# Altium footprint library con-samtec.PCBLIB: 805 footprints (part 15 of 55)
Each footprint in its own frame and in the unit in brackets; x right, y up, seen from the top. Pads: shape width x height; smd on the part's side, far side on the other; paste and mask are expansions set on the pad; w line width, h text height; cw(c..) or ccw(c..) is an arc to the next point about the centre after c.
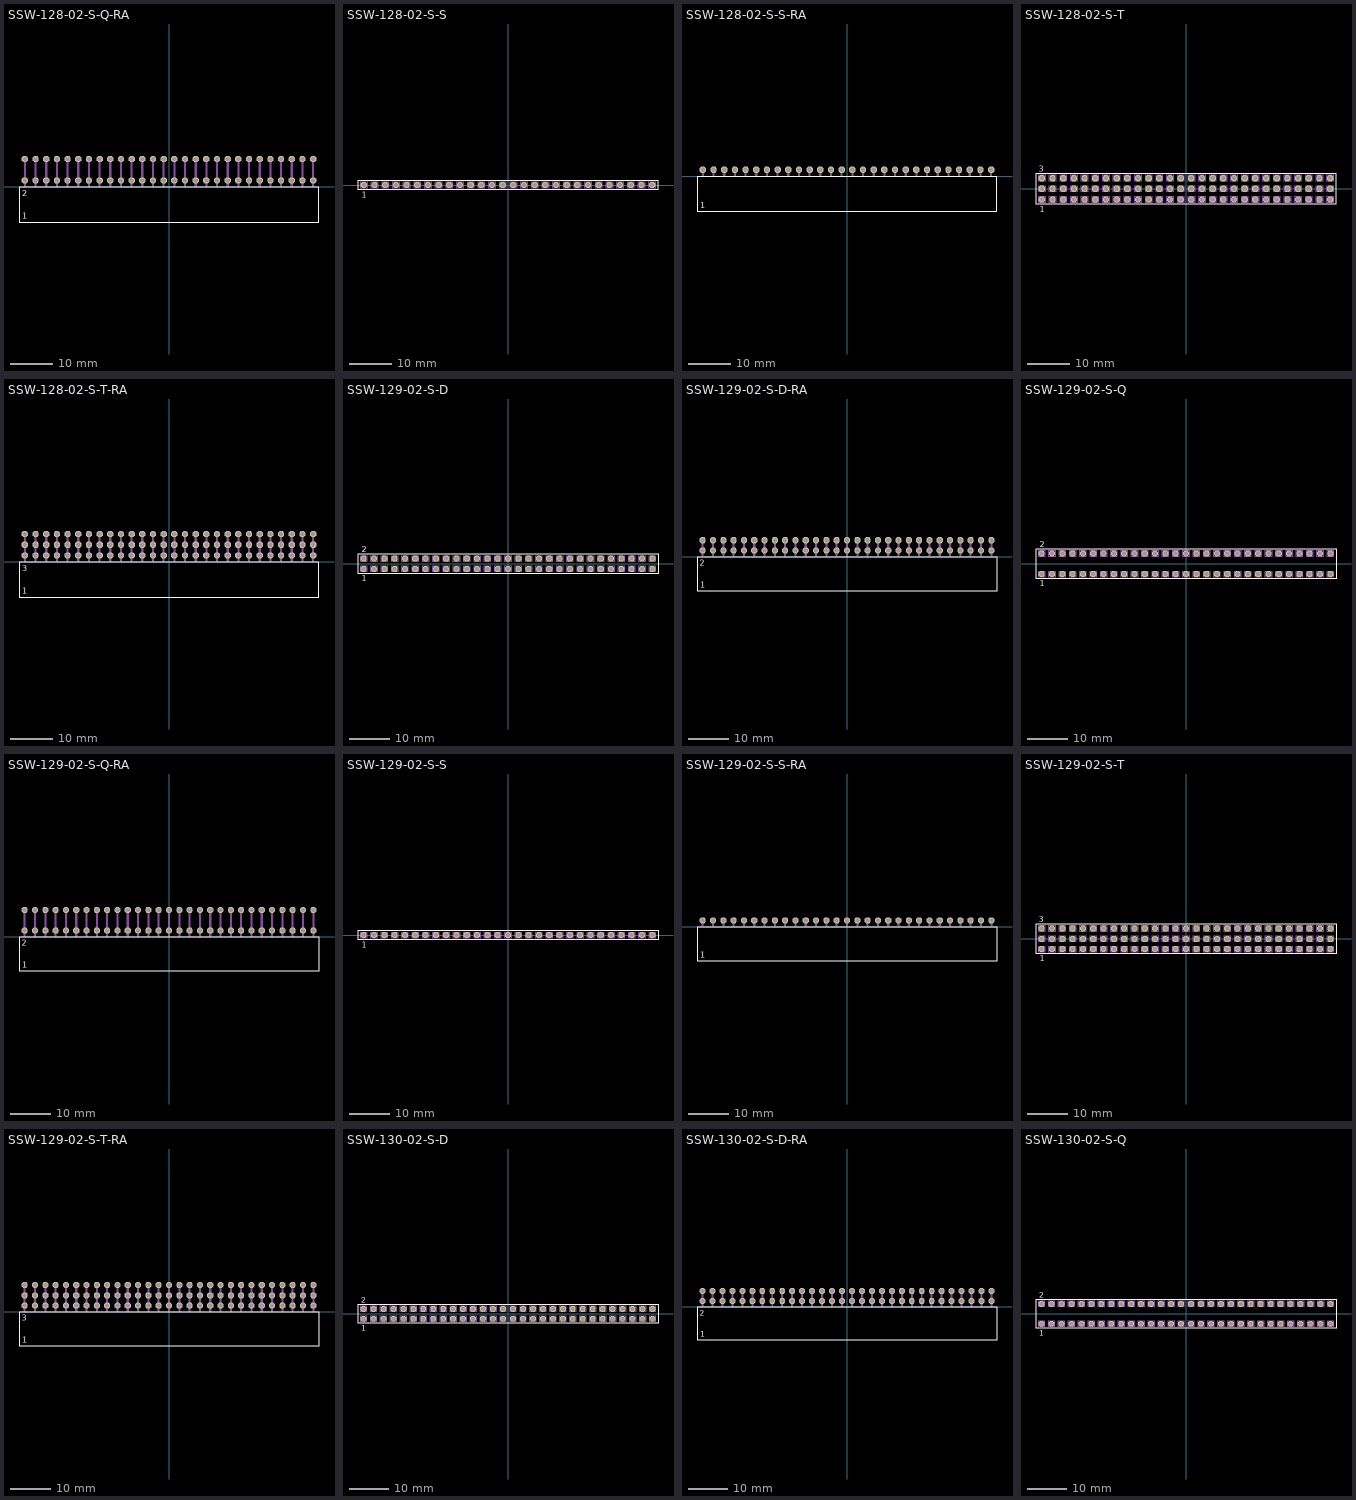
[diagram p14: the footprints below, top view; thin cyan lines are the x and y axes]

## SSW-128-02-S-Q-RA [mil]
pads (56):
  oct 59.06x59.06 hole 39.37: 1(-1350,60) 2(-1350,260) 3(-1250,60) 4(-1250,260) 5(-1150,60) 6(-1150,260) 7(-1050,60) 8(-1050,260) 9(-950,60) 10(-950,260) 11(-850,60) 12(-850,260) 13(-750,60) 14(-750,260) 15(-650,60) 16(-650,260) 17(-550,60) 18(-550,260) 19(-450,60) 20(-450,260) 21(-350,60) 22(-350,260) 23(-250,60) 24(-250,260) 25(-150,60) 26(-150,260) 27(-50,60) 28(-50,260) 29(50,60) 30(50,260) 31(150,60) 32(150,260) 33(250,60) 34(250,260) 35(350,60) 36(350,260) 37(450,60) 38(450,260) 39(550,60) 40(550,260) 41(650,60) 42(650,260) 43(750,60) 44(750,260) 45(850,60) 46(850,260) 47(950,60) 48(950,260) 49(1050,60) 50(1050,260) 51(1150,60) 52(1150,260) 53(1250,60) 54(1250,260) 55(1350,60) 56(1350,260)
Top Overlay:
  lines w8: -1405.08,-330.55 1405.08,-330.55 1405.08,-4.17 -1405.08,-4.17 -1405.08,-330.55
  text "1" at -1373.43,-301.18 h56.1
  text "2" at -1376.38,-86.61 h56.1
Mechanical 16:
  rectangle: -1360,0 -1340,270
  rectangle: -1260,0 -1240,270
  rectangle: -1160,0 -1140,270
  rectangle: -1060,0 -1040,270
  rectangle: -960,0 -940,270
  rectangle: -860,0 -840,270
  rectangle: -760,0 -740,270
  rectangle: -660,0 -640,270
  rectangle: -560,0 -540,270
  rectangle: -460,0 -440,270
  rectangle: -360,0 -340,270
  rectangle: -260,0 -240,270
  rectangle: -160,0 -140,270
  rectangle: -60,0 -40,270
  rectangle: 40,0 60,270
  rectangle: 140,0 160,270
  rectangle: 240,0 260,270
  rectangle: 340,0 360,270
  rectangle: 440,0 460,270
  rectangle: 540,0 560,270
  rectangle: 640,0 660,270
  rectangle: 740,0 760,270
  rectangle: 840,0 860,270
  rectangle: 940,0 960,270
  rectangle: 1040,0 1060,270
  rectangle: 1140,0 1160,270
  rectangle: 1240,0 1260,270
  rectangle: 1340,0 1360,270

## SSW-128-02-S-S [mm]
pads (28):
  oct 1.5x1.5 hole 1: 1(-34.29,0) 2(-31.75,0) 3(-29.21,0) 4(-26.67,0) 5(-24.13,0) 6(-21.59,0) 7(-19.05,0) 8(-16.51,0) 9(-13.97,0) 10(-11.43,0) 11(-8.89,0) 12(-6.35,0) 13(-3.81,0) 14(-1.27,0) 15(1.27,0) 16(3.81,0) 17(6.35,0) 18(8.89,0) 19(11.43,0) 20(13.97,0) 21(16.51,0) 22(19.05,0) 23(21.59,0) 24(24.13,0) 25(26.67,0) 26(29.21,0) 27(31.75,0) 28(34.29,0)
Top Overlay:
  lines w0.203: -35.689,-1.155 35.689,-1.155 35.689,1.155 -35.689,1.155 -35.689,-1.155
  text "1" at -34.798,-3.048 h1.42
Mechanical 16:
  lines w0.203: -35.035,-0.745 -33.535,-0.745 -33.535,0.755 -35.035,0.755 -35.035,-0.745 ; -32.495,-0.745 -30.995,-0.745 -30.995,0.755 -32.495,0.755 -32.495,-0.745 ; -29.955,-0.745 -28.455,-0.745 -28.455,0.755 -29.955,0.755 -29.955,-0.745 ; -27.415,-0.745 -25.915,-0.745 -25.915,0.755 -27.415,0.755 -27.415,-0.745 ; -24.875,-0.745 -23.375,-0.745 -23.375,0.755 -24.875,0.755 -24.875,-0.745 ; -22.335,-0.745 -20.835,-0.745 -20.835,0.755 -22.335,0.755 -22.335,-0.745 ; -19.795,-0.745 -18.295,-0.745 -18.295,0.755 -19.795,0.755 -19.795,-0.745 ; -17.255,-0.745 -15.755,-0.745 -15.755,0.755 -17.255,0.755 -17.255,-0.745 ; -14.715,-0.745 -13.215,-0.745 -13.215,0.755 -14.715,0.755 -14.715,-0.745 ; -12.175,-0.745 -10.675,-0.745 -10.675,0.755 -12.175,0.755 -12.175,-0.745 ; -9.635,-0.745 -8.135,-0.745 -8.135,0.755 -9.635,0.755 -9.635,-0.745 ; -7.095,-0.745 -5.595,-0.745 -5.595,0.755 -7.095,0.755 -7.095,-0.745 ; -4.555,-0.745 -3.055,-0.745 -3.055,0.755 -4.555,0.755 -4.555,-0.745 ; -2.015,-0.745 -0.515,-0.745 -0.515,0.755 -2.015,0.755 -2.015,-0.745 ; 0.525,-0.745 2.025,-0.745 2.025,0.755 0.525,0.755 0.525,-0.745 ; 3.065,-0.745 4.565,-0.745 4.565,0.755 3.065,0.755 3.065,-0.745 ; 5.605,-0.745 7.105,-0.745 7.105,0.755 5.605,0.755 5.605,-0.745 ; 8.145,-0.745 9.645,-0.745 9.645,0.755 8.145,0.755 8.145,-0.745 ; 10.685,-0.745 12.185,-0.745 12.185,0.755 10.685,0.755 10.685,-0.745 ; 13.225,-0.745 14.725,-0.745 14.725,0.755 13.225,0.755 13.225,-0.745 ; 15.765,-0.745 17.265,-0.745 17.265,0.755 15.765,0.755 15.765,-0.745 ; 18.305,-0.745 19.805,-0.745 19.805,0.755 18.305,0.755 18.305,-0.745 ; 20.845,-0.745 22.345,-0.745 22.345,0.755 20.845,0.755 20.845,-0.745 ; 23.385,-0.745 24.885,-0.745 24.885,0.755 23.385,0.755 23.385,-0.745 ; 25.925,-0.745 27.425,-0.745 27.425,0.755 25.925,0.755 25.925,-0.745 ; 28.465,-0.745 29.965,-0.745 29.965,0.755 28.465,0.755 28.465,-0.745 ; 31.005,-0.745 32.505,-0.745 32.505,0.755 31.005,0.755 31.005,-0.745 ; 33.545,-0.745 35.045,-0.745 35.045,0.755 33.545,0.755 33.545,-0.745

## SSW-128-02-S-S-RA [mil]
pads (28):
  oct 59.06x59.06 hole 39.37: 1(-1350,60) 2(-1250,60) 3(-1150,60) 4(-1050,60) 5(-950,60) 6(-850,60) 7(-750,60) 8(-650,60) 9(-550,60) 10(-450,60) 11(-350,60) 12(-250,60) 13(-150,60) 14(-50,60) 15(50,60) 16(150,60) 17(250,60) 18(350,60) 19(450,60) 20(550,60) 21(650,60) 22(750,60) 23(850,60) 24(950,60) 25(1050,60) 26(1150,60) 27(1250,60) 28(1350,60)
Top Overlay:
  lines w8: -1405.08,-330.55 1405.08,-330.55 1405.08,-4.17 -1405.08,-4.17 -1405.08,-330.55
  text "1" at -1373.43,-301.18 h56.1
Mechanical 16:
  rectangle: -1360,0 -1340,70
  rectangle: -1260,0 -1240,70
  rectangle: -1160,0 -1140,70
  rectangle: -1060,0 -1040,70
  rectangle: -960,0 -940,70
  rectangle: -860,0 -840,70
  rectangle: -760,0 -740,70
  rectangle: -660,0 -640,70
  rectangle: -560,0 -540,70
  rectangle: -460,0 -440,70
  rectangle: -360,0 -340,70
  rectangle: -260,0 -240,70
  rectangle: -160,0 -140,70
  rectangle: -60,0 -40,70
  rectangle: 40,0 60,70
  rectangle: 140,0 160,70
  rectangle: 240,0 260,70
  rectangle: 340,0 360,70
  rectangle: 440,0 460,70
  rectangle: 540,0 560,70
  rectangle: 640,0 660,70
  rectangle: 740,0 760,70
  rectangle: 840,0 860,70
  rectangle: 940,0 960,70
  rectangle: 1040,0 1060,70
  rectangle: 1140,0 1160,70
  rectangle: 1240,0 1260,70
  rectangle: 1340,0 1360,70

## SSW-128-02-S-T [mm]
pads (84):
  oct 1.5x1.5 hole 1: 1(-34.29,-2.54) 2(-34.29,0) 3(-34.29,2.54) 4(-31.75,-2.54) 5(-31.75,0) 6(-31.75,2.54) 7(-29.21,-2.54) 8(-29.21,0) 9(-29.21,2.54) 10(-26.67,-2.54) 11(-26.67,0) 12(-26.67,2.54) 13(-24.13,-2.54) 14(-24.13,0) 15(-24.13,2.54) 16(-21.59,-2.54) 17(-21.59,0) 18(-21.59,2.54) 19(-19.05,-2.54) 20(-19.05,0) 21(-19.05,2.54) 22(-16.51,-2.54) 23(-16.51,0) 24(-16.51,2.54) 25(-13.97,-2.54) 26(-13.97,0) 27(-13.97,2.54) 28(-11.43,-2.54) 29(-11.43,0) 30(-11.43,2.54) 31(-8.89,-2.54) 32(-8.89,0) 33(-8.89,2.54) 34(-6.35,-2.54) 35(-6.35,0) 36(-6.35,2.54) 37(-3.81,-2.54) 38(-3.81,0) 39(-3.81,2.54) 40(-1.27,-2.54) 41(-1.27,0) 42(-1.27,2.54) 43(1.27,-2.54) 44(1.27,0) 45(1.27,2.54) 46(3.81,-2.54) 47(3.81,0) 48(3.81,2.54) 49(6.35,-2.54) 50(6.35,0) 51(6.35,2.54) 52(8.89,-2.54) 53(8.89,0) 54(8.89,2.54) 55(11.43,-2.54) 56(11.43,0) 57(11.43,2.54) 58(13.97,-2.54) 59(13.97,0) 60(13.97,2.54) 61(16.51,-2.54) 62(16.51,0) 63(16.51,2.54) 64(19.05,-2.54) 65(19.05,0) 66(19.05,2.54) 67(21.59,-2.54) 68(21.59,0) 69(21.59,2.54) 70(24.13,-2.54) 71(24.13,0) 72(24.13,2.54) 73(26.67,-2.54) 74(26.67,0) 75(26.67,2.54) 76(29.21,-2.54) 77(29.21,0) 78(29.21,2.54) 79(31.75,-2.54) 80(31.75,0) 81(31.75,2.54) 82(34.29,-2.54) 83(34.29,0) 84(34.29,2.54)
Top Overlay:
  lines w0.203: -35.689,-3.695 35.689,-3.695 35.689,3.695 -35.689,3.695 -35.689,-3.695
  text "1" at -34.798,-5.588 h1.42
  text "3" at -35.052,4.064 h1.42
Mechanical 16:
  drawing of 336 lines, arcs and shapes, not listed

## SSW-128-02-S-T-RA [mil]
pads (84):
  oct 59.06x59.06 hole 39.37: 1(-1350,60) 2(-1350,160) 3(-1350,260) 4(-1250,60) 5(-1250,160) 6(-1250,260) 7(-1150,60) 8(-1150,160) 9(-1150,260) 10(-1050,60) 11(-1050,160) 12(-1050,260) 13(-950,60) 14(-950,160) 15(-950,260) 16(-850,60) 17(-850,160) 18(-850,260) 19(-750,60) 20(-750,160) 21(-750,260) 22(-650,60) 23(-650,160) 24(-650,260) 25(-550,60) 26(-550,160) 27(-550,260) 28(-450,60) 29(-450,160) 30(-450,260) 31(-350,60) 32(-350,160) 33(-350,260) 34(-250,60) 35(-250,160) 36(-250,260) 37(-150,60) 38(-150,160) 39(-150,260) 40(-50,60) 41(-50,160) 42(-50,260) 43(50,60) 44(50,160) 45(50,260) 46(150,60) 47(150,160) 48(150,260) 49(250,60) 50(250,160) 51(250,260) 52(350,60) 53(350,160) 54(350,260) 55(450,60) 56(450,160) 57(450,260) 58(550,60) 59(550,160) 60(550,260) 61(650,60) 62(650,160) 63(650,260) 64(750,60) 65(750,160) 66(750,260) 67(850,60) 68(850,160) 69(850,260) 70(950,60) 71(950,160) 72(950,260) 73(1050,60) 74(1050,160) 75(1050,260) 76(1150,60) 77(1150,160) 78(1150,260) 79(1250,60) 80(1250,160) 81(1250,260) 82(1350,60) 83(1350,160) 84(1350,260)
Top Overlay:
  lines w8: -1405.08,-330.55 1405.08,-330.55 1405.08,-4.17 -1405.08,-4.17 -1405.08,-330.55
  text "1" at -1373.43,-301.18 h56.1
  text "3" at -1376.38,-86.61 h56.1
Mechanical 16:
  rectangle: -1360,0 -1340,270
  rectangle: -1260,0 -1240,270
  rectangle: -1160,0 -1140,270
  rectangle: -1060,0 -1040,270
  rectangle: -960,0 -940,270
  rectangle: -860,0 -840,270
  rectangle: -760,0 -740,270
  rectangle: -660,0 -640,270
  rectangle: -560,0 -540,270
  rectangle: -460,0 -440,270
  rectangle: -360,0 -340,270
  rectangle: -260,0 -240,270
  rectangle: -160,0 -140,270
  rectangle: -60,0 -40,270
  rectangle: 40,0 60,270
  rectangle: 140,0 160,270
  rectangle: 240,0 260,270
  rectangle: 340,0 360,270
  rectangle: 440,0 460,270
  rectangle: 540,0 560,270
  rectangle: 640,0 660,270
  rectangle: 740,0 760,270
  rectangle: 840,0 860,270
  rectangle: 940,0 960,270
  rectangle: 1040,0 1060,270
  rectangle: 1140,0 1160,270
  rectangle: 1240,0 1260,270
  rectangle: 1340,0 1360,270

## SSW-129-02-S-D [mm]
pads (58):
  oct 1.5x1.5 hole 1: 1(-35.56,-1.27) 2(-35.56,1.27) 3(-33.02,-1.27) 4(-33.02,1.27) 5(-30.48,-1.27) 6(-30.48,1.27) 7(-27.94,-1.27) 8(-27.94,1.27) 9(-25.4,-1.27) 10(-25.4,1.27) 11(-22.86,-1.27) 12(-22.86,1.27) 13(-20.32,-1.27) 14(-20.32,1.27) 15(-17.78,-1.27) 16(-17.78,1.27) 17(-15.24,-1.27) 18(-15.24,1.27) 19(-12.7,-1.27) 20(-12.7,1.27) 21(-10.16,-1.27) 22(-10.16,1.27) 23(-7.62,-1.27) 24(-7.62,1.27) 25(-5.08,-1.27) 26(-5.08,1.27) 27(-2.54,-1.27) 28(-2.54,1.27) 29(0,-1.27) 30(0,1.27) 31(2.54,-1.27) 32(2.54,1.27) 33(5.08,-1.27) 34(5.08,1.27) 35(7.62,-1.27) 36(7.62,1.27) 37(10.16,-1.27) 38(10.16,1.27) 39(12.7,-1.27) 40(12.7,1.27) 41(15.24,-1.27) 42(15.24,1.27) 43(17.78,-1.27) 44(17.78,1.27) 45(20.32,-1.27) 46(20.32,1.27) 47(22.86,-1.27) 48(22.86,1.27) 49(25.4,-1.27) 50(25.4,1.27) 51(27.94,-1.27) 52(27.94,1.27) 53(30.48,-1.27) 54(30.48,1.27) 55(33.02,-1.27) 56(33.02,1.27) 57(35.56,-1.27) 58(35.56,1.27)
Top Overlay:
  lines w0.203: -36.959,-2.425 36.959,-2.425 36.959,2.425 -36.959,2.425 -36.959,-2.425
  text "1" at -36.068,-4.318 h1.42
  text "2" at -36.068,2.794 h1.42
Mechanical 16:
  drawing of 232 lines, arcs and shapes, not listed

## SSW-129-02-S-D-RA [mil]
pads (58):
  oct 59.06x59.06 hole 39.37: 1(-1400,60) 2(-1400,160) 3(-1300,60) 4(-1300,160) 5(-1200,60) 6(-1200,160) 7(-1100,60) 8(-1100,160) 9(-1000,60) 10(-1000,160) 11(-900,60) 12(-900,160) 13(-800,60) 14(-800,160) 15(-700,60) 16(-700,160) 17(-600,60) 18(-600,160) 19(-500,60) 20(-500,160) 21(-400,60) 22(-400,160) 23(-300,60) 24(-300,160) 25(-200,60) 26(-200,160) 27(-100,60) 28(-100,160) 29(0,60) 30(0,160) 31(100,60) 32(100,160) 33(200,60) 34(200,160) 35(300,60) 36(300,160) 37(400,60) 38(400,160) 39(500,60) 40(500,160) 41(600,60) 42(600,160) 43(700,60) 44(700,160) 45(800,60) 46(800,160) 47(900,60) 48(900,160) 49(1000,60) 50(1000,160) 51(1100,60) 52(1100,160) 53(1200,60) 54(1200,160) 55(1300,60) 56(1300,160) 57(1400,60) 58(1400,160)
Top Overlay:
  lines w8: -1455.08,-330.55 1455.08,-330.55 1455.08,-4.17 -1455.08,-4.17 -1455.08,-330.55
  text "1" at -1423.43,-301.18 h56.1
  text "2" at -1426.38,-86.61 h56.1
Mechanical 16:
  rectangle: -1410,0 -1390,170
  rectangle: -1310,0 -1290,170
  rectangle: -1210,0 -1190,170
  rectangle: -1110,0 -1090,170
  rectangle: -1010,0 -990,170
  rectangle: -910,0 -890,170
  rectangle: -810,0 -790,170
  rectangle: -710,0 -690,170
  rectangle: -610,0 -590,170
  rectangle: -510,0 -490,170
  rectangle: -410,0 -390,170
  rectangle: -310,0 -290,170
  rectangle: -210,0 -190,170
  rectangle: -110,0 -90,170
  rectangle: -10,0 10,170
  rectangle: 90,0 110,170
  rectangle: 190,0 210,170
  rectangle: 290,0 310,170
  rectangle: 390,0 410,170
  rectangle: 490,0 510,170
  rectangle: 590,0 610,170
  rectangle: 690,0 710,170
  rectangle: 790,0 810,170
  rectangle: 890,0 910,170
  rectangle: 990,0 1010,170
  rectangle: 1090,0 1110,170
  rectangle: 1190,0 1210,170
  rectangle: 1290,0 1310,170
  rectangle: 1390,0 1410,170

## SSW-129-02-S-Q [mm]
pads (58):
  oct 1.5x1.5 hole 1: 1(-35.56,-2.54) 2(-35.56,2.54) 3(-33.02,-2.54) 4(-33.02,2.54) 5(-30.48,-2.54) 6(-30.48,2.54) 7(-27.94,-2.54) 8(-27.94,2.54) 9(-25.4,-2.54) 10(-25.4,2.54) 11(-22.86,-2.54) 12(-22.86,2.54) 13(-20.32,-2.54) 14(-20.32,2.54) 15(-17.78,-2.54) 16(-17.78,2.54) 17(-15.24,-2.54) 18(-15.24,2.54) 19(-12.7,-2.54) 20(-12.7,2.54) 21(-10.16,-2.54) 22(-10.16,2.54) 23(-7.62,-2.54) 24(-7.62,2.54) 25(-5.08,-2.54) 26(-5.08,2.54) 27(-2.54,-2.54) 28(-2.54,2.54) 29(0,-2.54) 30(0,2.54) 31(2.54,-2.54) 32(2.54,2.54) 33(5.08,-2.54) 34(5.08,2.54) 35(7.62,-2.54) 36(7.62,2.54) 37(10.16,-2.54) 38(10.16,2.54) 39(12.7,-2.54) 40(12.7,2.54) 41(15.24,-2.54) 42(15.24,2.54) 43(17.78,-2.54) 44(17.78,2.54) 45(20.32,-2.54) 46(20.32,2.54) 47(22.86,-2.54) 48(22.86,2.54) 49(25.4,-2.54) 50(25.4,2.54) 51(27.94,-2.54) 52(27.94,2.54) 53(30.48,-2.54) 54(30.48,2.54) 55(33.02,-2.54) 56(33.02,2.54) 57(35.56,-2.54) 58(35.56,2.54)
Top Overlay:
  lines w0.203: -36.959,-3.695 36.959,-3.695 36.959,3.695 -36.959,3.695 -36.959,-3.695
  text "1" at -36.068,-5.588 h1.42
  text "2" at -36.068,4.064 h1.42
Mechanical 16:
  drawing of 232 lines, arcs and shapes, not listed

## SSW-129-02-S-Q-RA [mil]
pads (58):
  oct 59.06x59.06 hole 39.37: 1(-1400,60) 2(-1400,260) 3(-1300,60) 4(-1300,260) 5(-1200,60) 6(-1200,260) 7(-1100,60) 8(-1100,260) 9(-1000,60) 10(-1000,260) 11(-900,60) 12(-900,260) 13(-800,60) 14(-800,260) 15(-700,60) 16(-700,260) 17(-600,60) 18(-600,260) 19(-500,60) 20(-500,260) 21(-400,60) 22(-400,260) 23(-300,60) 24(-300,260) 25(-200,60) 26(-200,260) 27(-100,60) 28(-100,260) 29(0,60) 30(0,260) 31(100,60) 32(100,260) 33(200,60) 34(200,260) 35(300,60) 36(300,260) 37(400,60) 38(400,260) 39(500,60) 40(500,260) 41(600,60) 42(600,260) 43(700,60) 44(700,260) 45(800,60) 46(800,260) 47(900,60) 48(900,260) 49(1000,60) 50(1000,260) 51(1100,60) 52(1100,260) 53(1200,60) 54(1200,260) 55(1300,60) 56(1300,260) 57(1400,60) 58(1400,260)
Top Overlay:
  lines w8: -1455.08,-330.55 1455.08,-330.55 1455.08,-4.17 -1455.08,-4.17 -1455.08,-330.55
  text "1" at -1423.43,-301.18 h56.1
  text "2" at -1426.38,-86.61 h56.1
Mechanical 16:
  rectangle: -1410,0 -1390,270
  rectangle: -1310,0 -1290,270
  rectangle: -1210,0 -1190,270
  rectangle: -1110,0 -1090,270
  rectangle: -1010,0 -990,270
  rectangle: -910,0 -890,270
  rectangle: -810,0 -790,270
  rectangle: -710,0 -690,270
  rectangle: -610,0 -590,270
  rectangle: -510,0 -490,270
  rectangle: -410,0 -390,270
  rectangle: -310,0 -290,270
  rectangle: -210,0 -190,270
  rectangle: -110,0 -90,270
  rectangle: -10,0 10,270
  rectangle: 90,0 110,270
  rectangle: 190,0 210,270
  rectangle: 290,0 310,270
  rectangle: 390,0 410,270
  rectangle: 490,0 510,270
  rectangle: 590,0 610,270
  rectangle: 690,0 710,270
  rectangle: 790,0 810,270
  rectangle: 890,0 910,270
  rectangle: 990,0 1010,270
  rectangle: 1090,0 1110,270
  rectangle: 1190,0 1210,270
  rectangle: 1290,0 1310,270
  rectangle: 1390,0 1410,270

## SSW-129-02-S-S [mm]
pads (29):
  oct 1.5x1.5 hole 1: 1(-35.56,0) 2(-33.02,0) 3(-30.48,0) 4(-27.94,0) 5(-25.4,0) 6(-22.86,0) 7(-20.32,0) 8(-17.78,0) 9(-15.24,0) 10(-12.7,0) 11(-10.16,0) 12(-7.62,0) 13(-5.08,0) 14(-2.54,0) 15(0,0) 16(2.54,0) 17(5.08,0) 18(7.62,0) 19(10.16,0) 20(12.7,0) 21(15.24,0) 22(17.78,0) 23(20.32,0) 24(22.86,0) 25(25.4,0) 26(27.94,0) 27(30.48,0) 28(33.02,0) 29(35.56,0)
Top Overlay:
  lines w0.203: -36.959,-1.155 36.959,-1.155 36.959,1.155 -36.959,1.155 -36.959,-1.155
  text "1" at -36.068,-3.048 h1.42
Mechanical 16:
  lines w0.203: -36.305,-0.745 -34.805,-0.745 -34.805,0.755 -36.305,0.755 -36.305,-0.745 ; -33.765,-0.745 -32.265,-0.745 -32.265,0.755 -33.765,0.755 -33.765,-0.745 ; -31.225,-0.745 -29.725,-0.745 -29.725,0.755 -31.225,0.755 -31.225,-0.745 ; -28.685,-0.745 -27.185,-0.745 -27.185,0.755 -28.685,0.755 -28.685,-0.745 ; -26.145,-0.745 -24.645,-0.745 -24.645,0.755 -26.145,0.755 -26.145,-0.745 ; -23.605,-0.745 -22.105,-0.745 -22.105,0.755 -23.605,0.755 -23.605,-0.745 ; -21.065,-0.745 -19.565,-0.745 -19.565,0.755 -21.065,0.755 -21.065,-0.745 ; -18.525,-0.745 -17.025,-0.745 -17.025,0.755 -18.525,0.755 -18.525,-0.745 ; -15.985,-0.745 -14.485,-0.745 -14.485,0.755 -15.985,0.755 -15.985,-0.745 ; -13.445,-0.745 -11.945,-0.745 -11.945,0.755 -13.445,0.755 -13.445,-0.745 ; -10.905,-0.745 -9.405,-0.745 -9.405,0.755 -10.905,0.755 -10.905,-0.745 ; -8.365,-0.745 -6.865,-0.745 -6.865,0.755 -8.365,0.755 -8.365,-0.745 ; -5.825,-0.745 -4.325,-0.745 -4.325,0.755 -5.825,0.755 -5.825,-0.745 ; -3.285,-0.745 -1.785,-0.745 -1.785,0.755 -3.285,0.755 -3.285,-0.745 ; -0.745,-0.745 0.755,-0.745 0.755,0.755 -0.745,0.755 -0.745,-0.745 ; 1.795,-0.745 3.295,-0.745 3.295,0.755 1.795,0.755 1.795,-0.745 ; 4.335,-0.745 5.835,-0.745 5.835,0.755 4.335,0.755 4.335,-0.745 ; 6.875,-0.745 8.375,-0.745 8.375,0.755 6.875,0.755 6.875,-0.745 ; 9.415,-0.745 10.915,-0.745 10.915,0.755 9.415,0.755 9.415,-0.745 ; 11.955,-0.745 13.455,-0.745 13.455,0.755 11.955,0.755 11.955,-0.745 ; 14.495,-0.745 15.995,-0.745 15.995,0.755 14.495,0.755 14.495,-0.745 ; 17.035,-0.745 18.535,-0.745 18.535,0.755 17.035,0.755 17.035,-0.745 ; 19.575,-0.745 21.075,-0.745 21.075,0.755 19.575,0.755 19.575,-0.745 ; 22.115,-0.745 23.615,-0.745 23.615,0.755 22.115,0.755 22.115,-0.745 ; 24.655,-0.745 26.155,-0.745 26.155,0.755 24.655,0.755 24.655,-0.745 ; 27.195,-0.745 28.695,-0.745 28.695,0.755 27.195,0.755 27.195,-0.745 ; 29.735,-0.745 31.235,-0.745 31.235,0.755 29.735,0.755 29.735,-0.745 ; 32.275,-0.745 33.775,-0.745 33.775,0.755 32.275,0.755 32.275,-0.745 ; 34.815,-0.745 36.315,-0.745 36.315,0.755 34.815,0.755 34.815,-0.745

## SSW-129-02-S-S-RA [mil]
pads (29):
  oct 59.06x59.06 hole 39.37: 1(-1400,60) 2(-1300,60) 3(-1200,60) 4(-1100,60) 5(-1000,60) 6(-900,60) 7(-800,60) 8(-700,60) 9(-600,60) 10(-500,60) 11(-400,60) 12(-300,60) 13(-200,60) 14(-100,60) 15(0,60) 16(100,60) 17(200,60) 18(300,60) 19(400,60) 20(500,60) 21(600,60) 22(700,60) 23(800,60) 24(900,60) 25(1000,60) 26(1100,60) 27(1200,60) 28(1300,60) 29(1400,60)
Top Overlay:
  lines w8: -1455.08,-330.55 1455.08,-330.55 1455.08,-4.17 -1455.08,-4.17 -1455.08,-330.55
  text "1" at -1423.43,-301.18 h56.1
Mechanical 16:
  rectangle: -1410,0 -1390,70
  rectangle: -1310,0 -1290,70
  rectangle: -1210,0 -1190,70
  rectangle: -1110,0 -1090,70
  rectangle: -1010,0 -990,70
  rectangle: -910,0 -890,70
  rectangle: -810,0 -790,70
  rectangle: -710,0 -690,70
  rectangle: -610,0 -590,70
  rectangle: -510,0 -490,70
  rectangle: -410,0 -390,70
  rectangle: -310,0 -290,70
  rectangle: -210,0 -190,70
  rectangle: -110,0 -90,70
  rectangle: -10,0 10,70
  rectangle: 90,0 110,70
  rectangle: 190,0 210,70
  rectangle: 290,0 310,70
  rectangle: 390,0 410,70
  rectangle: 490,0 510,70
  rectangle: 590,0 610,70
  rectangle: 690,0 710,70
  rectangle: 790,0 810,70
  rectangle: 890,0 910,70
  rectangle: 990,0 1010,70
  rectangle: 1090,0 1110,70
  rectangle: 1190,0 1210,70
  rectangle: 1290,0 1310,70
  rectangle: 1390,0 1410,70

## SSW-129-02-S-T [mm]
pads (87):
  oct 1.5x1.5 hole 1: 1(-35.56,-2.54) 2(-35.56,0) 3(-35.56,2.54) 4(-33.02,-2.54) 5(-33.02,0) 6(-33.02,2.54) 7(-30.48,-2.54) 8(-30.48,0) 9(-30.48,2.54) 10(-27.94,-2.54) 11(-27.94,0) 12(-27.94,2.54) 13(-25.4,-2.54) 14(-25.4,0) 15(-25.4,2.54) 16(-22.86,-2.54) 17(-22.86,0) 18(-22.86,2.54) 19(-20.32,-2.54) 20(-20.32,0) 21(-20.32,2.54) 22(-17.78,-2.54) 23(-17.78,0) 24(-17.78,2.54) 25(-15.24,-2.54) 26(-15.24,0) 27(-15.24,2.54) 28(-12.7,-2.54) 29(-12.7,0) 30(-12.7,2.54) 31(-10.16,-2.54) 32(-10.16,0) 33(-10.16,2.54) 34(-7.62,-2.54) 35(-7.62,0) 36(-7.62,2.54) 37(-5.08,-2.54) 38(-5.08,0) 39(-5.08,2.54) 40(-2.54,-2.54) 41(-2.54,0) 42(-2.54,2.54) 43(0,-2.54) 44(0,0) 45(0,2.54) 46(2.54,-2.54) 47(2.54,0) 48(2.54,2.54) 49(5.08,-2.54) 50(5.08,0) 51(5.08,2.54) 52(7.62,-2.54) 53(7.62,0) 54(7.62,2.54) 55(10.16,-2.54) 56(10.16,0) 57(10.16,2.54) 58(12.7,-2.54) 59(12.7,0) 60(12.7,2.54) 61(15.24,-2.54) 62(15.24,0) 63(15.24,2.54) 64(17.78,-2.54) 65(17.78,0) 66(17.78,2.54) 67(20.32,-2.54) 68(20.32,0) 69(20.32,2.54) 70(22.86,-2.54) 71(22.86,0) 72(22.86,2.54) 73(25.4,-2.54) 74(25.4,0) 75(25.4,2.54) 76(27.94,-2.54) 77(27.94,0) 78(27.94,2.54) 79(30.48,-2.54) 80(30.48,0) 81(30.48,2.54) 82(33.02,-2.54) 83(33.02,0) 84(33.02,2.54) 85(35.56,-2.54) 86(35.56,0) 87(35.56,2.54)
Top Overlay:
  lines w0.203: -36.959,-3.695 36.959,-3.695 36.959,3.695 -36.959,3.695 -36.959,-3.695
  text "1" at -36.068,-5.588 h1.42
  text "3" at -36.322,4.064 h1.42
Mechanical 16:
  drawing of 348 lines, arcs and shapes, not listed

## SSW-129-02-S-T-RA [mil]
pads (87):
  oct 59.06x59.06 hole 39.37: 1(-1400,60) 2(-1400,160) 3(-1400,260) 4(-1300,60) 5(-1300,160) 6(-1300,260) 7(-1200,60) 8(-1200,160) 9(-1200,260) 10(-1100,60) 11(-1100,160) 12(-1100,260) 13(-1000,60) 14(-1000,160) 15(-1000,260) 16(-900,60) 17(-900,160) 18(-900,260) 19(-800,60) 20(-800,160) 21(-800,260) 22(-700,60) 23(-700,160) 24(-700,260) 25(-600,60) 26(-600,160) 27(-600,260) 28(-500,60) 29(-500,160) 30(-500,260) 31(-400,60) 32(-400,160) 33(-400,260) 34(-300,60) 35(-300,160) 36(-300,260) 37(-200,60) 38(-200,160) 39(-200,260) 40(-100,60) 41(-100,160) 42(-100,260) 43(0,60) 44(0,160) 45(0,260) 46(100,60) 47(100,160) 48(100,260) 49(200,60) 50(200,160) 51(200,260) 52(300,60) 53(300,160) 54(300,260) 55(400,60) 56(400,160) 57(400,260) 58(500,60) 59(500,160) 60(500,260) 61(600,60) 62(600,160) 63(600,260) 64(700,60) 65(700,160) 66(700,260) 67(800,60) 68(800,160) 69(800,260) 70(900,60) 71(900,160) 72(900,260) 73(1000,60) 74(1000,160) 75(1000,260) 76(1100,60) 77(1100,160) 78(1100,260) 79(1200,60) 80(1200,160) 81(1200,260) 82(1300,60) 83(1300,160) 84(1300,260) 85(1400,60) 86(1400,160) 87(1400,260)
Top Overlay:
  lines w8: -1455.08,-330.55 1455.08,-330.55 1455.08,-4.17 -1455.08,-4.17 -1455.08,-330.55
  text "1" at -1423.43,-301.18 h56.1
  text "3" at -1426.38,-86.61 h56.1
Mechanical 16:
  rectangle: -1410,0 -1390,270
  rectangle: -1310,0 -1290,270
  rectangle: -1210,0 -1190,270
  rectangle: -1110,0 -1090,270
  rectangle: -1010,0 -990,270
  rectangle: -910,0 -890,270
  rectangle: -810,0 -790,270
  rectangle: -710,0 -690,270
  rectangle: -610,0 -590,270
  rectangle: -510,0 -490,270
  rectangle: -410,0 -390,270
  rectangle: -310,0 -290,270
  rectangle: -210,0 -190,270
  rectangle: -110,0 -90,270
  rectangle: -10,0 10,270
  rectangle: 90,0 110,270
  rectangle: 190,0 210,270
  rectangle: 290,0 310,270
  rectangle: 390,0 410,270
  rectangle: 490,0 510,270
  rectangle: 590,0 610,270
  rectangle: 690,0 710,270
  rectangle: 790,0 810,270
  rectangle: 890,0 910,270
  rectangle: 990,0 1010,270
  rectangle: 1090,0 1110,270
  rectangle: 1190,0 1210,270
  rectangle: 1290,0 1310,270
  rectangle: 1390,0 1410,270

## SSW-130-02-S-D [mm]
pads (60):
  oct 1.5x1.5 hole 1: 1(-36.83,-1.27) 2(-36.83,1.27) 3(-34.29,-1.27) 4(-34.29,1.27) 5(-31.75,-1.27) 6(-31.75,1.27) 7(-29.21,-1.27) 8(-29.21,1.27) 9(-26.67,-1.27) 10(-26.67,1.27) 11(-24.13,-1.27) 12(-24.13,1.27) 13(-21.59,-1.27) 14(-21.59,1.27) 15(-19.05,-1.27) 16(-19.05,1.27) 17(-16.51,-1.27) 18(-16.51,1.27) 19(-13.97,-1.27) 20(-13.97,1.27) 21(-11.43,-1.27) 22(-11.43,1.27) 23(-8.89,-1.27) 24(-8.89,1.27) 25(-6.35,-1.27) 26(-6.35,1.27) 27(-3.81,-1.27) 28(-3.81,1.27) 29(-1.27,-1.27) 30(-1.27,1.27) 31(1.27,-1.27) 32(1.27,1.27) 33(3.81,-1.27) 34(3.81,1.27) 35(6.35,-1.27) 36(6.35,1.27) 37(8.89,-1.27) 38(8.89,1.27) 39(11.43,-1.27) 40(11.43,1.27) 41(13.97,-1.27) 42(13.97,1.27) 43(16.51,-1.27) 44(16.51,1.27) 45(19.05,-1.27) 46(19.05,1.27) 47(21.59,-1.27) 48(21.59,1.27) 49(24.13,-1.27) 50(24.13,1.27) 51(26.67,-1.27) 52(26.67,1.27) 53(29.21,-1.27) 54(29.21,1.27) 55(31.75,-1.27) 56(31.75,1.27) 57(34.29,-1.27) 58(34.29,1.27) 59(36.83,-1.27) 60(36.83,1.27)
Top Overlay:
  lines w0.203: -38.229,-2.425 38.229,-2.425 38.229,2.425 -38.229,2.425 -38.229,-2.425
  text "1" at -37.338,-4.318 h1.42
  text "2" at -37.338,2.794 h1.42
Mechanical 16:
  drawing of 240 lines, arcs and shapes, not listed

## SSW-130-02-S-D-RA [mil]
pads (60):
  oct 59.06x59.06 hole 39.37: 1(-1450,60) 2(-1450,160) 3(-1350,60) 4(-1350,160) 5(-1250,60) 6(-1250,160) 7(-1150,60) 8(-1150,160) 9(-1050,60) 10(-1050,160) 11(-950,60) 12(-950,160) 13(-850,60) 14(-850,160) 15(-750,60) 16(-750,160) 17(-650,60) 18(-650,160) 19(-550,60) 20(-550,160) 21(-450,60) 22(-450,160) 23(-350,60) 24(-350,160) 25(-250,60) 26(-250,160) 27(-150,60) 28(-150,160) 29(-50,60) 30(-50,160) 31(50,60) 32(50,160) 33(150,60) 34(150,160) 35(250,60) 36(250,160) 37(350,60) 38(350,160) 39(450,60) 40(450,160) 41(550,60) 42(550,160) 43(650,60) 44(650,160) 45(750,60) 46(750,160) 47(850,60) 48(850,160) 49(950,60) 50(950,160) 51(1050,60) 52(1050,160) 53(1150,60) 54(1150,160) 55(1250,60) 56(1250,160) 57(1350,60) 58(1350,160) 59(1450,60) 60(1450,160)
Top Overlay:
  lines w8: -1505.08,-330.55 1505.08,-330.55 1505.08,-4.17 -1505.08,-4.17 -1505.08,-330.55
  text "1" at -1473.43,-301.18 h56.1
  text "2" at -1476.38,-86.61 h56.1
Mechanical 16:
  rectangle: -1460,0 -1440,170
  rectangle: -1360,0 -1340,170
  rectangle: -1260,0 -1240,170
  rectangle: -1160,0 -1140,170
  rectangle: -1060,0 -1040,170
  rectangle: -960,0 -940,170
  rectangle: -860,0 -840,170
  rectangle: -760,0 -740,170
  rectangle: -660,0 -640,170
  rectangle: -560,0 -540,170
  rectangle: -460,0 -440,170
  rectangle: -360,0 -340,170
  rectangle: -260,0 -240,170
  rectangle: -160,0 -140,170
  rectangle: -60,0 -40,170
  rectangle: 40,0 60,170
  rectangle: 140,0 160,170
  rectangle: 240,0 260,170
  rectangle: 340,0 360,170
  rectangle: 440,0 460,170
  rectangle: 540,0 560,170
  rectangle: 640,0 660,170
  rectangle: 740,0 760,170
  rectangle: 840,0 860,170
  rectangle: 940,0 960,170
  rectangle: 1040,0 1060,170
  rectangle: 1140,0 1160,170
  rectangle: 1240,0 1260,170
  rectangle: 1340,0 1360,170
  rectangle: 1440,0 1460,170

## SSW-130-02-S-Q [mm]
pads (60):
  oct 1.5x1.5 hole 1: 1(-36.83,-2.54) 2(-36.83,2.54) 3(-34.29,-2.54) 4(-34.29,2.54) 5(-31.75,-2.54) 6(-31.75,2.54) 7(-29.21,-2.54) 8(-29.21,2.54) 9(-26.67,-2.54) 10(-26.67,2.54) 11(-24.13,-2.54) 12(-24.13,2.54) 13(-21.59,-2.54) 14(-21.59,2.54) 15(-19.05,-2.54) 16(-19.05,2.54) 17(-16.51,-2.54) 18(-16.51,2.54) 19(-13.97,-2.54) 20(-13.97,2.54) 21(-11.43,-2.54) 22(-11.43,2.54) 23(-8.89,-2.54) 24(-8.89,2.54) 25(-6.35,-2.54) 26(-6.35,2.54) 27(-3.81,-2.54) 28(-3.81,2.54) 29(-1.27,-2.54) 30(-1.27,2.54) 31(1.27,-2.54) 32(1.27,2.54) 33(3.81,-2.54) 34(3.81,2.54) 35(6.35,-2.54) 36(6.35,2.54) 37(8.89,-2.54) 38(8.89,2.54) 39(11.43,-2.54) 40(11.43,2.54) 41(13.97,-2.54) 42(13.97,2.54) 43(16.51,-2.54) 44(16.51,2.54) 45(19.05,-2.54) 46(19.05,2.54) 47(21.59,-2.54) 48(21.59,2.54) 49(24.13,-2.54) 50(24.13,2.54) 51(26.67,-2.54) 52(26.67,2.54) 53(29.21,-2.54) 54(29.21,2.54) 55(31.75,-2.54) 56(31.75,2.54) 57(34.29,-2.54) 58(34.29,2.54) 59(36.83,-2.54) 60(36.83,2.54)
Top Overlay:
  lines w0.203: -38.229,-3.695 38.229,-3.695 38.229,3.695 -38.229,3.695 -38.229,-3.695
  text "1" at -37.338,-5.588 h1.42
  text "2" at -37.338,4.064 h1.42
Mechanical 16:
  drawing of 240 lines, arcs and shapes, not listed